# Altium footprint library MMT_Connectors_Buttons_Switches.PcbLib: 46 footprints (part 3 of 3)
Each footprint in its own frame and in the unit in brackets; x right, y up, seen from the top. Pads: shape width x height; smd on the part's side, far side on the other; paste and mask are expansions set on the pad; w line width, h text height; cw(c..) or ccw(c..) is an arc to the next point about the centre after c.
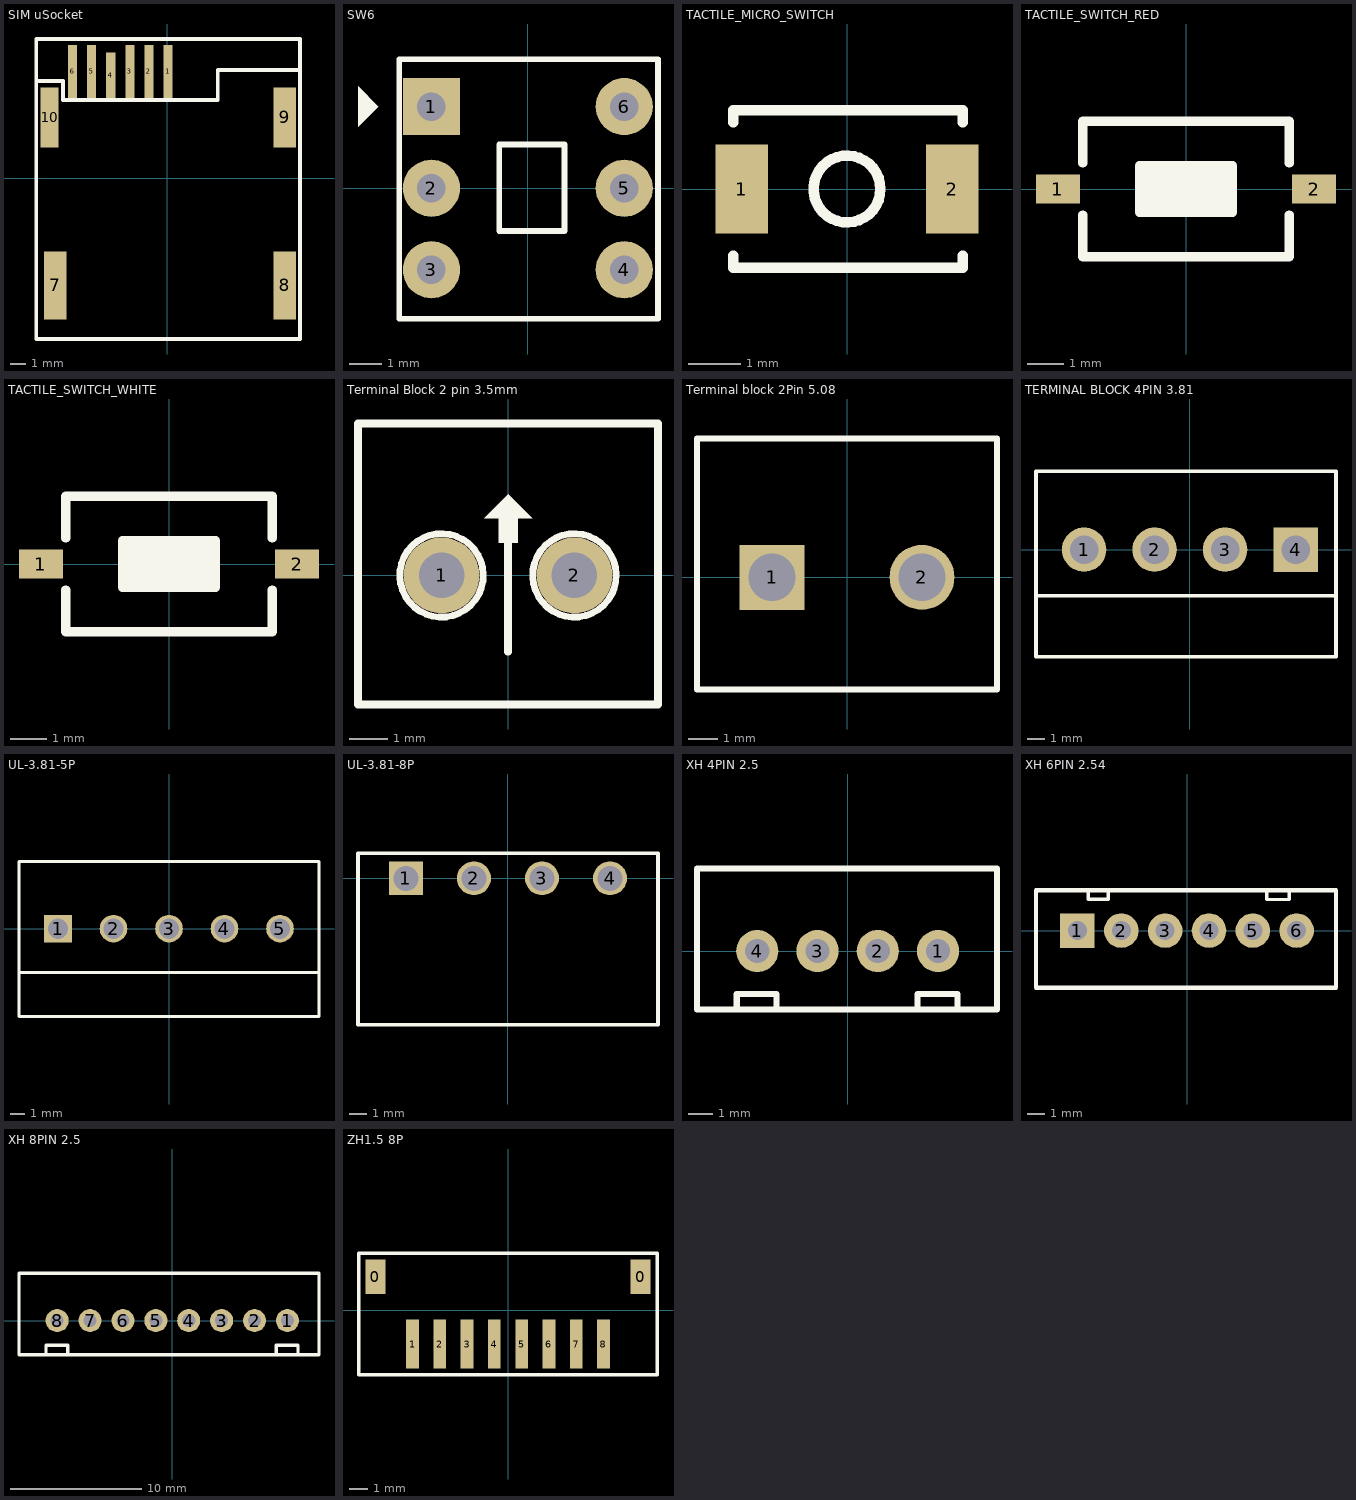
[diagram p2: the footprints below, top view; thin cyan lines are the x and y axes]

## SIM uSocket [mm]
pads (10):
  rect 0.6x3.5 smd: 1(0.064,7.112) 2(-1.206,7.112) 3(-2.476,7.112) 5(-5.016,7.112) 6(-6.286,7.112)
  rect 0.6x3 smd: 4(-3.746,6.858)
  rect 1.5x4.5 smd: 7(-7.429,-7.112) 8(7.81,-7.112)
  rect 1.5x4 smd: 9(7.81,4.064)
  rect 1.2x4 smd: 10(-7.81,4.064)
Top Overlay:
  lines w0.127: -7.301,-10.668 7.556,-10.668
  lines w0.254: -8.7,6.477 -6.921,6.477 -6.921,5.207 3.365,5.207 3.365,7.207 7.556,7.207 8.826,7.207 8.826,-9.398 ; 8.826,-8.763 8.826,-10.668 7.556,-10.668 -8.7,-10.668 -8.7,7.207 -8.7,9.017 -8.7,9.271 8.572,9.271 8.826,9.271 8.826,6.985
3D body "User Library-Sim Holder.STEP": height 1.35, standoff 0, extent -8.132,-9.286 8.268,7.914

## SW6 [mil] "SW DTDP - 6Pin 260x300x300 mil"
pads (6):
  rect 70x70 hole 35: 1(-118.11,100)
  round 70 hole 35: 2(-118.11,0) 3(-118.11,-100) 4(118.11,-100) 5(118.11,0) 6(118.11,100)
Top Overlay:
  region: -208.11,125 -183.11,100 -208.11,75
  lines w7: -157.48,-160 159.45,-160 159.45,158 -157.48,158 -157.48,-160 ; -35.03,-52.56 44.97,-52.56 44.97,53.44 -35.03,53.44 -35.03,-52.56
3D body "User Library-PSM1-0-0.STEP": height 532.1, standoff -137.19, extent -155.51,-158.86 159.45,156.1

## TACTILE_MICRO_SWITCH [mm]
pads (2):
  rect 1x1.7 smd: 1(-2,0) 2(2,0)
Top Overlay:
  circle w0.2: c0,0 r0.635
  lines w0.2: -2.159,-1.27 -2.159,-1.5 2.2,-1.5 2.2,-1.27 ; -2.159,1.27 -2.159,1.5 2.2,1.5 2.2,1.27
3D body "b3u-1000p.stp": height 1.6, standoff 0, extent -2,-1.25 2,1.25

## TACTILE_SWITCH_RED [mm] "Tactile Switch SMD Red Actuator"
pads (2):
  rect 1.2x0.8 smd: 1(-3.5,0) 2(3.5,0)
Top Overlay:
  rectangle: -1.27,-0.635 1.27,0.635
  lines w0.254: -2.819,-0.711 -2.819,-1.854 2.819,-1.854 2.819,-0.711 ; -2.819,0.711 -2.819,1.854 2.819,1.854 2.819,0.711 ; -1.27,-0.635 -1.27,0.635 1.27,0.635 1.27,-0.635 -1.27,-0.635
3D body "User Library-Button-SMD.step": height 2.5, standoff 0, extent -3.05,-1.85 3.05,1.85

## TACTILE_SWITCH_WHITE [mm] "Tactile Switch SMD White Actuator"
pads (2):
  rect 1.2x0.8 smd: 1(-3.5,0) 2(3.5,0)
Top Overlay:
  rectangle: -1.27,-0.635 1.27,0.635
  lines w0.254: -2.819,-0.711 -2.819,-1.854 2.819,-1.854 2.819,-0.711 ; -2.819,0.711 -2.819,1.854 2.819,1.854 2.819,0.711 ; -1.27,-0.635 1.27,-0.635 1.27,0.635 -1.27,0.635 -1.27,-0.635
3D body "43680.stp": height 2.5, standoff 0, extent -3.65,-1.95 3.65,1.95

## Terminal Block 2 pin 3.5mm [mm] "Header 2, 2 pin, hight 300mil, Pin to Pin 200, Colour Green"
height 7.62
pads (2):
  round 2 hole 1.2: 1(-1.75,0) 2(1.75,0)
Top Overlay:
  region: 0.004,2.135 -0.631,1.5 -0.25,1.5 -0.25,0.865 0.258,0.865 0.258,1.5 0.639,1.5
  lines w0.178: -1.042,0.842 ccw(c-1.75,0) -1.019,0.822 ; 2.456,0.844 ccw(c1.75,0) 2.481,0.822
  lines w0.2: 0,-2.007 0,1.829 ; -3.95,-3.4 3.95,-3.4 3.95,4 -3.95,4 -3.95,-3.4
3D body "691214110002_Download_STP_691214110002_rev1.stp": height 8.67, standoff -3.52, extent -3.65,-3.4 3.75,4

## Terminal block 2Pin 5.08 [mm]
pads (2):
  rect 2.2x2.2 hole 1.6: 1(-2.54,0)
  round 2.2 hole 1.6: 2(2.54,0)
Top Overlay:
  lines w0.2: -5.08,-3.8 -5.08,4.7 5.08,4.7 5.08,-3.8 -5.08,-3.8
3D body "691311500002.stp": height 12.01, standoff -3.99, extent -5.08,-3.8 5.08,4.7

## TERMINAL BLOCK 4PIN 3.81 [mm]
pads (4):
  round 2.5 hole 1.6: 1(-5.94,0) 2(-1.98,0) 3(1.98,0)
  rect 2.5x2.5 hole 1.6: 4(5.94,0)
Top Overlay:
  lines w0.2: -8.64,-2.591 8.208,-2.591 ; -8.64,2.2 -8.64,4.4 8.208,4.4 8.208,-6.02 -8.64,-6.02 -8.64,2.278
3D body "691321300004.stp": height 9.21, standoff -3.49, extent -8.415,-3.009 8.015,4.191

## UL-3.81-5P [mm] "3,81mm - PCB Headers - Vertical - 05p"
height 9.2
pads (5):
  rect 1.9x1.9 hole 1.4: 1(-7.62,0)
  round 1.9 hole 1.4: 2(-3.81,0) 3(0,0) 4(3.81,0) 5(7.62,0)
Top Overlay:
  lines w0.2: -10.3,-3 -10.3,-6.02 10.3,-6.02 10.3,-3 ; -10.3,-3 10.3,-3 ; -10.3,-3 -10.3,4.6 10.3,4.6 10.3,-3
3D body "691321300005.stp": height 9.21, standoff -3.49, extent -10.12,-2.8 10.12,4.4

## UL-3.81-8P [mm] "3,81mm - PCB Headers"
height 9.2
pads (4):
  rect 1.9x1.9 hole 1.4: 1(-5.715,0)
  round 1.9 hole 1.4: 2(-1.905,0) 3(1.905,0) 4(5.715,0)
Top Overlay:
  lines w0.2: -8.395,-8.2 -8.395,-3 -8.395,1.4 8.4,1.4 8.4,-8.2 -8.395,-8.2
3D body "691322310004_Download_STP_691322310004_rev1.stp": height 7.2, standoff -3.5, extent -8.215,-8 8.215,1.2

## XH 4PIN 2.5 [mm]
pads (4):
  round 1.75 hole 1: 1(3.75,0) 2(1.25,0) 3(-1.25,0) 4(-3.75,0)
Top Overlay:
  lines w0.254: -4.599,-2.421 -4.599,-1.786 -2.948,-1.786 -2.948,-2.421 ; 2.901,-2.421 2.901,-1.786 4.552,-1.786 4.552,-2.421 ; -6.25,-2.421 -6.25,3.421 6.196,3.421 6.196,-2.421 -6.25,-2.421
3D body "User Library-jst-b4b-xh-a-1.step": height 7, standoff -3.4, extent -6.25,-2.375 6.15,3.375

## XH 6PIN 2.54 [mm]
pads (6):
  rect 2x2 hole 1.1: 1(-6.35,0)
  round 2 hole 1.1: 2(-3.81,0) 3(-1.27,0) 4(1.27,0) 5(3.81,0) 6(6.35,0)
Top Overlay:
  lines w0.2: -5.725,2.325 -5.725,1.825 -4.575,1.825 -4.575,2.325 4.625,2.325 4.625,1.8 5.925,1.8 5.925,2.3
  lines w0.254: -8.75,-3.3 -8.75,2.325 8.625,2.325 8.625,-0.425 8.625,-3.3 -8.75,-3.3
3D body "User Library-jst-b6b-xh-a.step": height 7, standoff -3.4, extent -8.725,-3.4 8.675,2.35

## XH 8PIN 2.5 [mm]
pads (8):
  round 1.75 hole 1: 1(8.75,0) 2(6.25,0) 3(3.75,0) 4(1.25,0) 5(-1.25,0) 6(-3.75,0) 7(-6.25,0) 8(-8.75,0)
Top Overlay:
  lines w0.254: -9.599,-2.521 -9.599,-1.886 -7.948,-1.886 -7.948,-2.521 ; 7.901,-2.521 7.901,-1.886 9.552,-1.886 9.552,-2.521 ; -11.65,-2.6 -11.65,3.6 11.15,3.6 11.15,-2.6 -11.65,-2.6
3D body "User Library-B8B-XH-A.step": height 7, standoff -3.4, extent -11.45,-2.4 10.95,3.35

## ZH1.5 8P [mm]
pads (10):
  rect 1.1x1.9 smd: 0(-7.3,1.85) 0(7.3,1.85)
  rect 0.7x2.7 smd: 1(-5.25,-1.85) 2(-3.75,-1.85) 3(-2.25,-1.85) 4(-0.75,-1.85) 5(0.75,-1.85) 6(2.25,-1.85) 7(3.75,-1.85) 8(5.25,-1.85)
Top Overlay:
  lines w0.2: -8.2,-3.55 8.2,-3.55 8.2,3.15 -8.2,3.15 -8.2,-3.55